# Altium footprint library Electronic Devices_LIB.PcbLib: 410 footprints (part 22 of 26)
Each footprint in its own frame and in the unit in brackets; x right, y up, seen from the top. Pads: shape width x height; smd on the part's side, far side on the other; paste and mask are expansions set on the pad; w line width, h text height; cw(c..) or ccw(c..) is an arc to the next point about the centre after c.
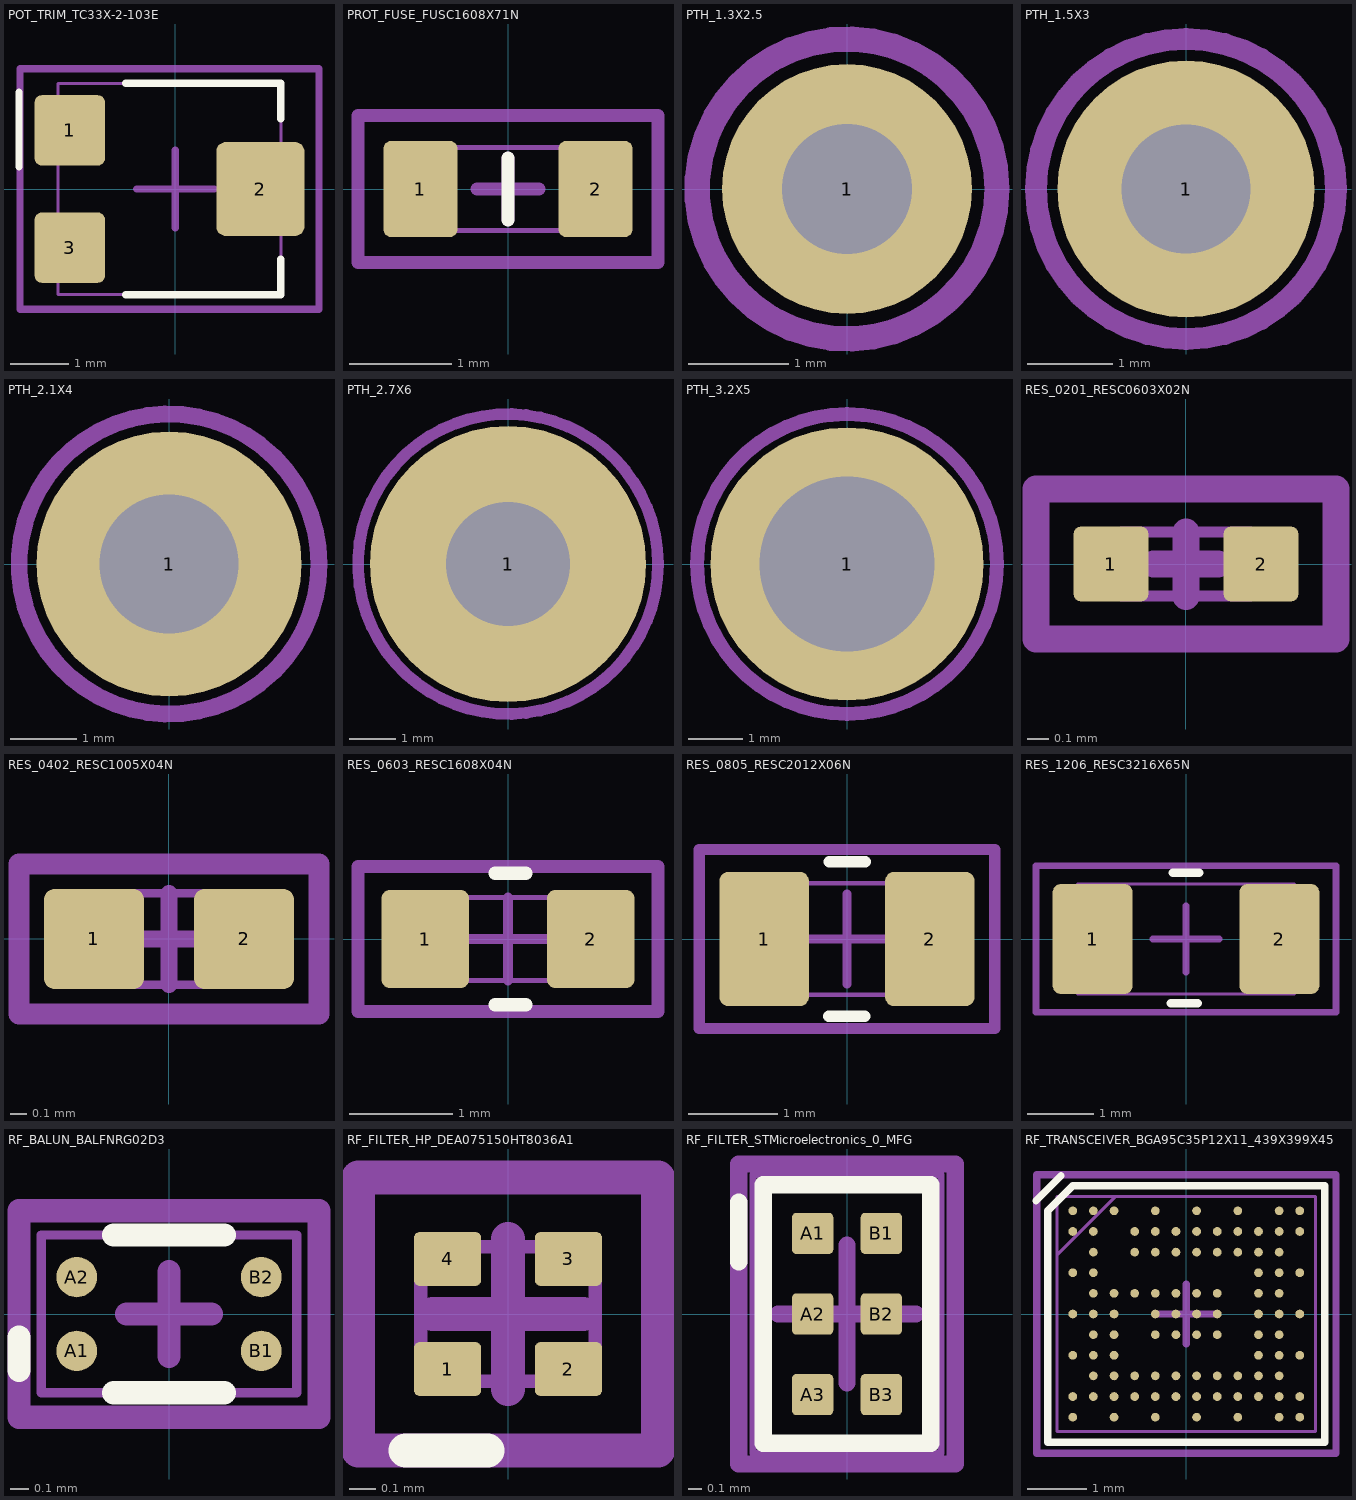
[diagram p21: the footprints below, top view; thin cyan lines are the x and y axes]

## POT_TRIM_TC33X-2-103E [mm]
pads (3):
  rrect20% 1.2x1.2 smd: 1(-1.8,1) 3(-1.8,-1)
  rrect20% 1.5x1.6 smd: 2(1.45,0)
Top Overlay:
  lines w0.127: -2.667,0.381 -2.667,1.651 ; -0.85,-1.8 1.8,-1.8 1.8,-1.2 ; -0.85,1.8 1.8,1.8 1.8,1.2
Top Assembly:
  lines w0.051: -2,-1.8 -2,1.8 1.8,1.8 1.8,-1.8 -2,-1.8
  text ".Designator" at -2.718,-0.059 h0.51
Top Courtyard:
  lines w0.127: -0.66,0 0,0 ; 0,-0.66 0,0 ; 0,0.66 0,0 ; 0.66,0 0,0 ; -2.65,-2.05 -2.65,2.05 2.45,2.05 2.45,-2.05 -2.65,-2.05
3D body "step_temp.STEP": height 1.1, standoff -0.1, extent -1.5,-1.9 1.5,1.9

## PROT_FUSE_FUSC1608X71N [mm] "SMD 0603 (1.60mm x 0.81mm x 0.63mm"
height 0.63
pads (2):
  rrect20% 0.72x0.94 smd: 1(-0.855,0) 2(0.855,0)
Top Overlay:
  lines w0.127: 0,-0.305 0,0.305
Top Assembly:
  lines w0.051: -0.8,-0.405 0.8,-0.405 0.8,0.405 -0.8,0.405 -0.8,-0.405
  text ".Designator" at -2.489,-0.212 h0.51
Top Courtyard:
  lines w0.127: -0.305,0 0,0 ; 0,-0.305 0,0 ; 0,0.305 0,0 ; 0.305,0 0,0 ; -1.465,-0.72 -1.465,0.72 1.465,0.72 1.465,-0.72 -1.465,-0.72
3D body "F0603E1R50FSTR.stp": height 0.71, standoff 0, extent -0.8,-0.405 0.8,0.405

## PTH_1.3X2.5 [mm] "PTH 3mm drill 2.5mm ring"
height 1
pads (1):
  round 2.5 hole 1.3 paste-10: 1(0,0)
Top Courtyard:
  circle w0.254: c0,0 r1.5
  lines w0.2: -0.75,0 0.75,0 ; 0,-0.75 0,0.75

## PTH_1.5X3 [mm] "PTH 1.5mm drill 3mm ring"
height 1
pads (1):
  round 3 hole 1.5 paste-10: 1(0,0)
Top Courtyard:
  circle w0.254: c0,0 r1.75
  lines w0.2: -0.75,0 0.75,0 ; 0,-0.75 0,0.75

## PTH_2.1X4 [mm] "PTH 2.1mm drill 4mm ring"
height 1
pads (1):
  round 4 hole 2.1 paste-10: 1(0,0)
Top Courtyard:
  circle w0.254: c0,0 r2.264
  lines w0.2: -0.75,0 0.75,0 ; 0,-0.75 0,0.75

## PTH_2.7X6 [mm] "PTH 2.7mm drill 6mm ring"
height 2.5
pads (1):
  round 6 hole 2.7 paste-10: 1(0,0)
Top Courtyard:
  circle w0.254: c0,0 r3.26
  lines w0.2: -0.75,0 0.75,0 ; 0,-0.75 0,0.75

## PTH_3.2X5 [mm] "PTH 3.2mm drill 5mm ring"
height 2.5
pads (1):
  round 5 hole 3.2 paste-10: 1(0,0)
Top Courtyard:
  circle w0.254: c0,0 r2.743
  lines w0.2: -0.75,0 0.75,0 ; 0,-0.75 0,0.75

## RES_0201_RESC0603X02N [mm] "Chip Resistor, 2-Leads, Body 0.60x0.30mm, IPC Medium Density"
height 0.23
pads (2):
  rrect20% 0.35x0.35 smd: 1(-0.35,0) 2(0.35,0)
Top Assembly:
  lines w0.051: -0.3,-0.15 -0.3,0.15 0.3,0.15 0.3,-0.15 -0.3,-0.15
  text ".Designator" at -2.54,-0.161 h0.51
Top Courtyard:
  lines w0.127: -0.15,0 0.15,0 ; 0,-0.15 0,0.15 ; -0.7,-0.35 -0.7,0.35 0.7,0.35 0.7,-0.35 -0.7,-0.35
3D body "STD(0201) M(0603).STEP": height 0.24, standoff 0.01, extent -0.3,-0.15 0.3,0.15

## RES_0402_RESC1005X04N [mm] "Chip Resistor, 2-Leads, Body 1.02x0.53mm, IPC Medium Density"
height 0.45
pads (2):
  rrect20% 0.6x0.6 smd: 1(-0.45,0) 2(0.45,0)
Top Assembly:
  lines w0.051: -0.525,-0.275 -0.525,0.275 0.525,0.275 0.525,-0.275 -0.525,-0.275
  text ".Designator" at -2.616,-0.161 h0.51
Top Courtyard:
  lines w0.1: -0.275,0 0.275,0 ; 0,-0.275 0,0.275
  lines w0.127: -0.9,-0.45 -0.9,0.45 0.9,0.45 0.9,-0.45 -0.9,-0.45
3D body "STD(0402) M(1005).STEP": height 0.36, standoff 0.01, extent -0.5,-0.25 0.5,0.25

## RES_0603_RESC1608X04N [mm] "Chip Resistor, 2-Leads, Body 1.60x0.80mm, IPC Medium Density"
height 0.45
pads (2):
  rrect20% 0.85x0.95 smd: 1(-0.8,0) 2(0.8,0)
Top Overlay:
  lines w0.127: -0.127,-0.635 0.173,-0.635 ; -0.127,0.635 0.173,0.635
Top Assembly:
  lines w0.051: -0.8,-0.4 0.8,-0.4 0.8,0.4 -0.8,0.4 -0.8,-0.4
  text ".Designator" at -2.108,-0.161 h0.51
Top Courtyard:
  lines w0.1: -0.4,0 0.4,0 ; 0,-0.4 0,0.4
  lines w0.127: -1.45,-0.7 1.45,-0.7 1.45,0.7 -1.45,0.7 -1.45,-0.7
3D body "STD(0603) M(1608).STEP": height 0.46, standoff 0.01, extent -0.8,-0.4 0.8,0.4

## RES_0805_RESC2012X06N [mm] "Chip Resistor, 2-Leads, Body 2.00x1.25mm, IPC Medium Density"
height 0.6
pads (2):
  rrect20% 1x1.5 smd: 1(-0.925,0) 2(0.925,0)
Top Overlay:
  lines w0.127: -0.203,-0.864 0.197,-0.864 ; -0.197,0.864 0.203,0.864
Top Assembly:
  lines w0.051: -1,-0.625 -1,0.625 1,0.625 1,-0.625 -1,-0.625
  text ".Designator" at -2.616,-0.136 h0.51
Top Courtyard:
  lines w0.1: -0.5,0 0.5,0 ; 0,-0.5 0,0.5
  lines w0.127: -1.65,-1 -1.65,1 1.65,1 1.65,-1 -1.65,-1
3D body "STD(0805) M(2012).STEP": height 0.46, standoff 0.01, extent -1,-0.65 1,0.6

## RES_1206_RESC3216X65N [mm] "RES SMD 1206"
height 0.7
pads (2):
  rrect20% 1.2x1.65 smd: 1(-1.4,0) 2(1.4,0)
Top Overlay:
  lines w0.127: -0.225,-0.965 0.175,-0.965 ; -0.2,0.991 0.2,0.991
Top Assembly:
  lines w0.051: -1.625,-0.825 -1.625,0.825 1.625,0.825 1.625,-0.825 -1.625,-0.825
  text ".Designator" at -2.489,-0.085 h0.51
Top Courtyard:
  lines w0.1: -0.5,0 0.5,0 ; 0,-0.5 0,0.5 ; -2.25,-1.1 -2.25,1.1 2.25,1.1 2.25,-1.1 -2.25,-1.1
3D body "1206 resistor.STEP": height 0.6, standoff 0, extent -1.575,-0.8 1.625,0.8

## RF_BALUN_BALFNRG02D3 [mm] "4-UFBGA, CSPBGA"
height 0.63
pads (4):
  round 0.22 smd mask+0.076: A1(-0.5,-0.2) A2(-0.5,0.2) B1(0.5,-0.2) B2(0.5,0.2)
Top Overlay:
  lines w0.127: -0.813,-0.305 -0.813,-0.127 ; -0.3,-0.427 0.3,-0.427 ; -0.3,0.428 0.3,0.428
Top Assembly:
  lines w0.051: -0.692,-0.427 0.692,-0.427 0.692,0.428 -0.692,0.428 -0.692,-0.427
  text ".Designator" at -2.388,-0.136 h0.51
Top Courtyard:
  lines w0.127: -0.229,0 0,0 ; 0,-0.229 0,0 ; 0,0.229 0,0 ; 0.229,0 0,0 ; -0.813,-0.559 0.813,-0.559 0.813,0.559 -0.813,0.559 -0.813,-0.559
3D body "BALF-NRG-02D3.stp": height 0.79, standoff 0, extent -0.692,-0.427 0.692,0.428

## RF_FILTER_HP_DEA075150HT8036A1 [mm]
pads (4):
  rrect20% 0.25x0.2 smd: 1(-0.225,-0.205) 2(0.225,-0.205) 3(0.225,0.205) 4(-0.225,0.205)
Top Overlay:
  lines w0.127: -0.381,-0.508 -0.076,-0.508
Top Assembly:
  lines w0.051: -0.325,-0.25 -0.325,0.25 0.325,0.25 0.325,-0.25 -0.325,-0.25
  text ".Designator" at -2.565,-0.186 h0.51
Top Courtyard:
  lines w0.127: -0.279,0 0,0 ; 0,-0.279 0,0 ; 0,0.279 0,0 ; 0.279,0 0,0 ; -0.559,-0.508 -0.559,0.508 0.559,0.508 0.559,-0.508 -0.559,-0.508
3D body "DEA075150HT-8036A1.stp": height 0.4, standoff 0, extent -0.33,-0.285 0.33,0.285

## RF_FILTER_STMicroelectronics_0_MFG [mm] "CSP package"
height 0.4
pads (6):
  rrect20% 0.3x0.3 smd paste-1000 mask+0.076: A1(-0.25,0.587) A2(-0.25,0) A3(-0.25,-0.587) B1(0.25,0.587) B2(0.25,0) B3(0.25,-0.587)
Top Overlay:
  lines w0.127: -0.787,0.381 -0.787,0.813 ; -0.61,-0.94 0.61,-0.94 0.61,0.94 -0.61,0.94 -0.61,-0.94
Top Paste:
  rectangle: 0.15,0.487 0.35,0.687
  rectangle: 0.15,-0.1 0.35,0.1
  rectangle: 0.15,-0.687 0.35,-0.487
  rectangle: -0.35,0.487 -0.15,0.687
  rectangle: -0.35,-0.1 -0.15,0.1
  rectangle: -0.35,-0.687 -0.15,-0.487
Top Solder:
  rectangle: 0.15,0.487 0.35,0.687
  rectangle: 0.15,-0.1 0.35,0.1
  rectangle: 0.15,-0.687 0.35,-0.487
  rectangle: -0.35,0.487 -0.15,0.687
  rectangle: -0.35,-0.1 -0.15,0.1
  rectangle: -0.35,-0.687 -0.15,-0.487
Top Assembly:
  lines w0.051: -0.686,-1.016 -0.686,1.016 0.686,1.016 0.686,-1.016 -0.686,-1.016
  text ".Designator" at -2.413,-0.11 h0.51
Top Courtyard:
  lines w0.127: -0.5,0 0.5,0 ; 0,-0.5 0,0.5 ; -0.787,-1.092 0.787,-1.092 0.787,1.092 -0.787,1.092 -0.787,-1.092
3D body "UNK_STMicroelectronics_MLPF-WB55-01E3_eec.STEP": height 0.25, standoff 0, extent -1.012,-1.312 1.012,1.312

## RF_TRANSCEIVER_BGA95C35P12X11_439X399X45 [mm] "95-WLCSP (4.39x3.85)"
height 0.447
pads (95):
  round 0.148 smd: A1(-1.925,1.75) A2(-1.575,1.75) A3(-1.225,1.75) A5(-0.525,1.75) A7(0.175,1.75) A9(0.875,1.75) A11(1.575,1.75) A12(1.925,1.75) B1(-1.925,1.4) B2(-1.575,1.4) B4(-0.875,1.4) B5(-0.525,1.4) B6(-0.175,1.4) B7(0.175,1.4) B8(0.525,1.4) B9(0.875,1.4) B10(1.225,1.4) B11(1.575,1.4) B12(1.925,1.4) C2(-1.575,1.05) C4(-0.875,1.05) C5(-0.525,1.05) C6(-0.175,1.05) C7(0.175,1.05) C8(0.525,1.05) C9(0.875,1.05) C10(1.225,1.05) C11(1.575,1.05) D1(-1.925,0.7) D2(-1.575,0.7) D10(1.225,0.7) D11(1.575,0.7) D12(1.925,0.7) E2(-1.575,0.35) E3(-1.225,0.35) E4(-0.875,0.35) E5(-0.525,0.35) E6(-0.175,0.35) E7(0.175,0.35) E8(0.525,0.35) E10(1.225,0.35) E11(1.575,0.35) F1(-1.925,0) F2(-1.575,0) F3(-1.225,0) F5(-0.525,0) F6(-0.175,0) F7(0.175,0) F8(0.525,0) F10(1.225,0) F11(1.575,0) F12(1.925,0) G2(-1.575,-0.35) G3(-1.225,-0.35) G5(-0.525,-0.35) G6(-0.175,-0.35) G7(0.175,-0.35) G8(0.525,-0.35) G10(1.225,-0.35) G11(1.575,-0.35) H1(-1.925,-0.7) H2(-1.575,-0.7) H3(-1.225,-0.7) H10(1.225,-0.7) H11(1.575,-0.7) H12(1.925,-0.7) J2(-1.575,-1.05) J3(-1.225,-1.05) J4(-0.875,-1.05) J5(-0.525,-1.05) J6(-0.175,-1.05) J7(0.175,-1.05) J8(0.525,-1.05) J9(0.875,-1.05) J10(1.225,-1.05) J11(1.575,-1.05) K1(-1.925,-1.4) K2(-1.575,-1.4) K3(-1.225,-1.4) K4(-0.875,-1.4) K5(-0.525,-1.4) K6(-0.175,-1.4) K7(0.175,-1.4) K8(0.525,-1.4) K9(0.875,-1.4) K10(1.225,-1.4) K11(1.575,-1.4) K12(1.925,-1.4) L1(-1.925,-1.75) L3(-1.225,-1.75) L5(-0.525,-1.75) L7(0.175,-1.75) L9(0.875,-1.75) L11(1.575,-1.75) L12(1.925,-1.75)
Top Overlay:
  lines w0.127: -2.549,1.922 -2.125,2.346 ; -2.349,-2.174 2.349,-2.174 2.349,2.174 -1.925,2.174 -2.349,1.75 -2.349,-2.174
Top Assembly:
  lines w0.051: -2.195,0.998 -1.197,1.996 ; -2.195,-1.997 2.195,-1.997 2.195,1.997 -2.195,1.997 -2.195,-1.997
  text ".Designator" at -2.54,-0.11 h0.51
Top Courtyard:
  lines w0.127: -0.508,0 0,0 ; 0,-0.508 0,0 ; 0,0.508 0,0 ; 0.508,0 0,0 ; -2.54,-2.362 2.54,-2.362 2.54,2.362 -2.54,2.362 -2.54,-2.362
3D body "NRF5340-CLAA-R.stp": height 0.45, standoff 0, extent -2.195,-1.997 2.195,1.997